# Altium footprint library PcbLib1.PcbLib: 13 footprints
Each footprint in its own frame and in the unit in brackets; x right, y up, seen from the top. Pads: shape width x height; smd on the part's side, far side on the other; paste and mask are expansions set on the pad; w line width, h text height; cw(c..) or ccw(c..) is an arc to the next point about the centre after c.
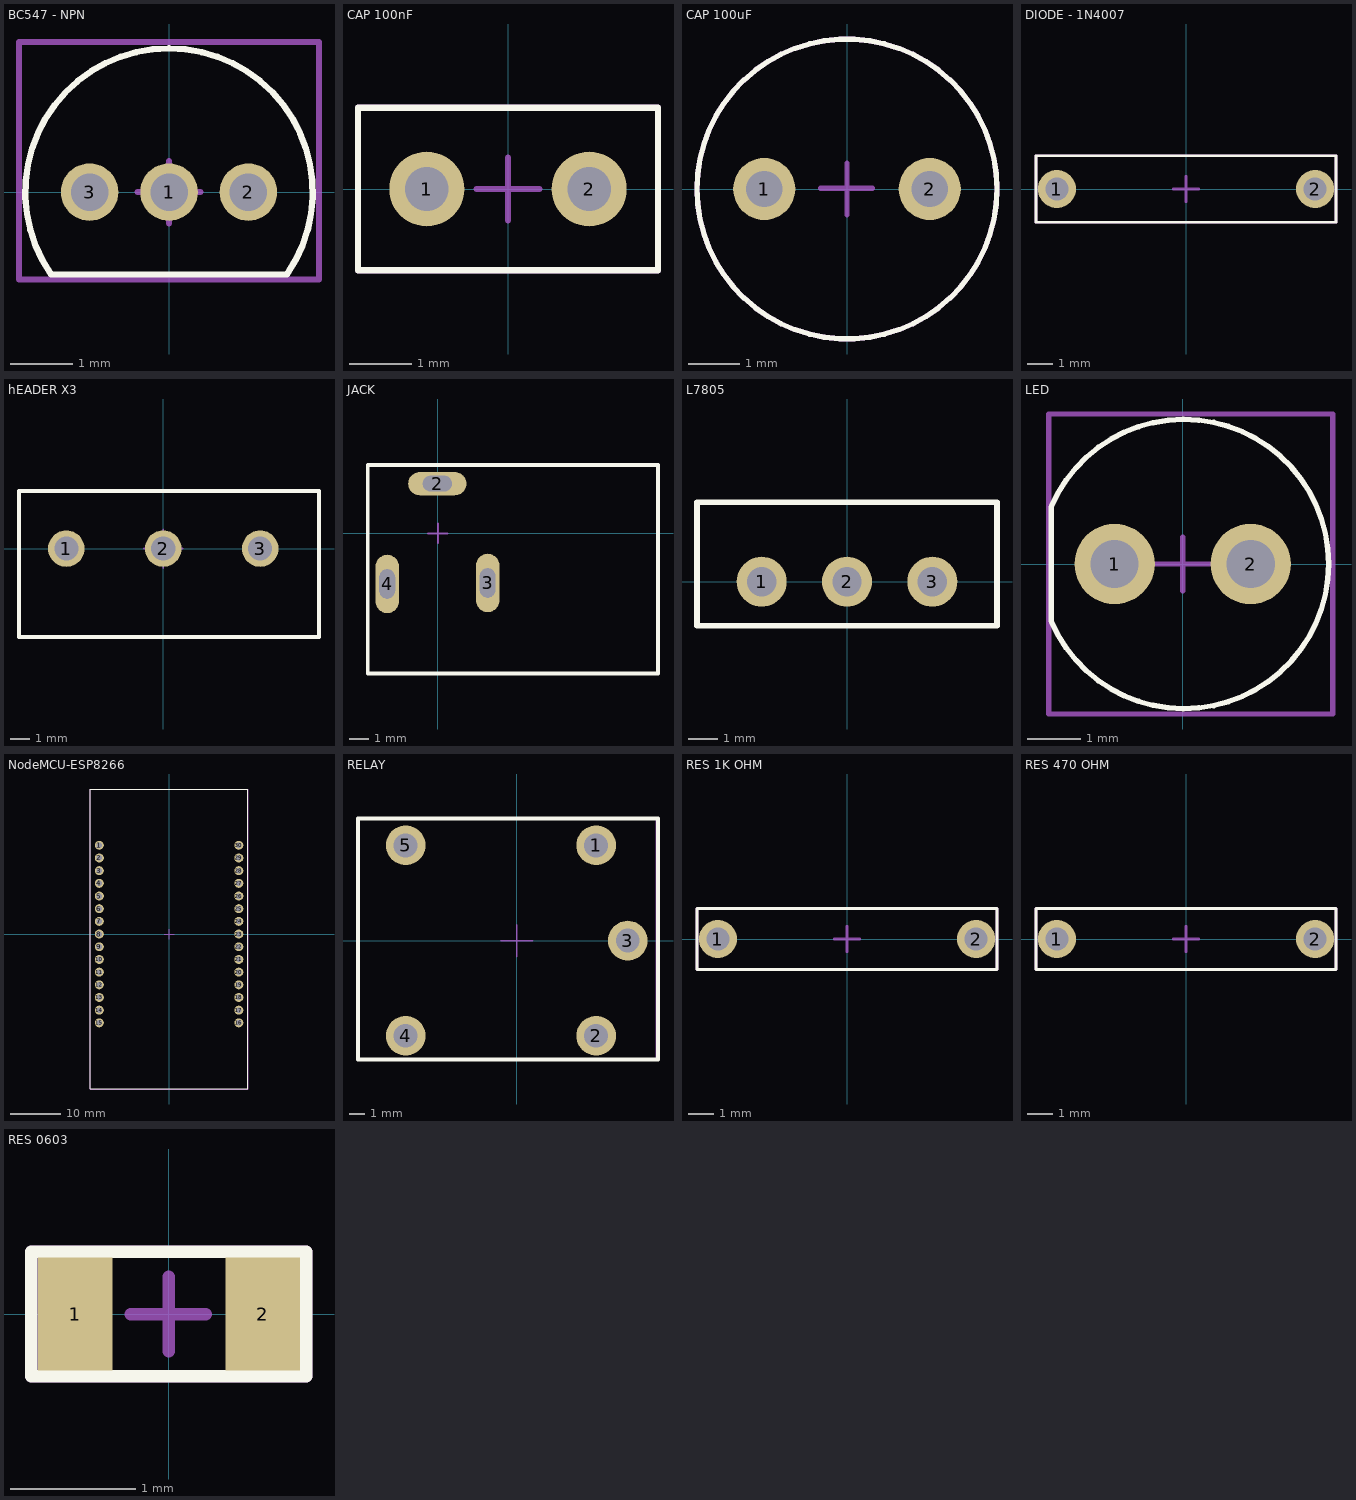
[diagram p0: the footprints below, top view; thin cyan lines are the x and y axes]

## BC547 - NPN [mm]
pads (3):
  round 0.92 hole 0.6 mask+0.05: 1(0,0) 2(1.27,0) 3(-1.27,0)
Top Overlay:
  lines w0.1: -1.884,-1.319 cw(c0,0) 1.884,-1.319 -1.883,-1.319
Top Component Center:
  lines w0.1: -0.5,0 0.5,0 ; 0,-0.5 0,0.5 ; -2.4,-1.4 2.4,-1.4 2.4,2.4 -2.4,2.4 -2.4,-1.4
Top Designator:
  lines w0.1: -2.4,-1.4 -2.4,2.4 2.4,2.4 2.4,-1.4 -2.4,-1.4
  text "'.Designator'" at -2.8,-0.5 h0.5
3D body "bc547b.stp": height 5.33, standoff -13.47, extent -2.35,-1.376 2.35,2.35

## CAP 100nF [mm]
pads (2):
  round 1.2 hole 0.7 mask+0.05: 1(-1.3,0) 2(1.3,0)
Top Overlay:
  lines w0.1: -2.4,-1.3 -2.4,1.3 2.4,1.3 2.4,-1.3 -2.4,-1.3
Top Component Center:
  lines w0.1: -0.5,0 0.5,0 ; 0,-0.5 0,0.5 ; -2.4,-1.3 -2.4,1.3 2.4,1.3 2.4,-1.3 -2.4,-1.3
Top Designator:
  lines w0.1: -2.4,-1.3 2.4,-1.3 2.4,1.3 -2.4,1.3 -2.4,-1.3
  text "'.Designator'" at -2.9,-0.4 h0.5
3D body "10pF Ceramic Disc 2.STEP": height 7.35, standoff -6.68, extent -2.35,-1.25 2.35,1.25

## CAP 100uF [mm]
pads (2):
  round 1.2 hole 0.7 mask+0.05: 1(-1.6,0) 2(1.6,0)
Top Overlay:
  circle w0.1: c0,0 r2.9
Top Component Center:
  circle w0.1: c0,0 r2.9
  lines w0.1: -0.509,0.014 0.491,0.014 ; 0,-0.5 0,0.5
Top Designator:
  circle w0.1: c0,0 r2.9
  text "'.Designator'" at -3,-0.3 h0.5
3D body "100uF 16V electr 6.3 x11mm -P.diameter 3.2mm-Black-White.stp": height 11.2, standoff -3.9, extent -3.15,-3.147 3.15,3.147

## DIODE - 1N4007 [mm]
pads (2):
  round 1.5 hole 0.9 mask+0.05: 1(-5.08,0) 2(5.08,0)
Top Overlay:
  lines w0.1: -5.9,-1.3 5.9,-1.3 5.9,1.3 -5.9,1.3 -5.9,-1.3
Top Component Center:
  lines w0.1: -0.5,0 0.5,0 ; 0,-0.5 0,0.5 ; -5.9,-1.3 5.9,-1.3 5.9,1.3 -5.9,1.3 -5.9,-1.3
Top Designator:
  lines w0.1: -5.9,-1.3 5.9,-1.3 5.9,1.3 -5.9,1.3 -5.9,-1.3
  text "'.Designator'" at -3.1,-0.4 h0.5
3D body "1N4007P10.STEP": height 3.58, standoff -2.17, extent -5.35,-1.25 5.35,1.25

## hEADER X3 [mm]
pads (3):
  round 1.9 hole 1.25: 1(-5.04,0) 2(0,0) 3(5.04,0)
Top Overlay:
  lines w0.2: -7.5,-4.6 8.1,-4.6 8.1,3 -7.5,3 -7.5,-4.6
Top Component Center:
  lines w0.1: -1,0 1,0 ; 0,-1 0,1 ; -7.5,-4.6 -7.5,3 8.1,3 8.1,-4.6 -7.5,-4.6
Top Designator:
  lines w0.1: -7.5,-4.6 -7.5,3 8.1,3 8.1,-4.6 -7.5,-4.6
  text "'.Designator'" at -5.9,-1 h1
3D body "User Library-Terminal-Screw-3A-3way.step": height 10, standoff -3, extent -7.5,-4.6 8.1,3

## JACK [mm]
pads (3):
  oval 3x1.2 hole 0.8 slot 1.5 at 0 deg: 2(-0.025,2.55)
  oval 1.2x3 hole 0.8 slot 1.5 at 90 deg: 3(2.558,-2.548) 4(-2.6,-2.6)
Top Overlay:
  lines w0.2: -3.6,-7.2 11.3,-7.2 11.3,3.5 -3.6,3.5 -3.6,-7.2
Top Component Center:
  lines w0.1: -0.5,0 0.5,0 ; 0,-0.5 0,0.5 ; -3.6,-7.2 11.3,-7.2 11.3,3.5 -3.6,3.5 -3.6,-7.2
Top Designator:
  lines w0.1: -3.6,-7.2 11.3,-7.2 11.3,3.5 -3.6,3.5 -3.6,-7.2
  text "'.Designator'" at -1.7,-2.6 h1
3D body "DC Power Jack 5.5mm x 2.1mm.STEP": height 10.78, standoff -3.6, extent -3.46,-7.02 11.16,2.75

## L7805 [mm]
pads (3):
  round 1.7 hole 1 mask+0.05: 1(-2.9,0) 2(0,0) 3(2.9,0)
Top Overlay:
  lines w0.2: -5.1,-1.5 5.1,-1.5 5.1,2.7 -5.1,2.7 -5.1,-1.5
Top Component Center:
  lines w0.1: -0.5,0 0.5,0 ; 0,-0.5 0,0.5 ; -5.1,-1.5 5.1,-1.5 5.1,2.7 -5.1,2.7 -5.1,-1.5
Top Designator:
  lines w0.1: -5.1,-1.5 -5.1,2.7 5.1,2.7 5.1,-1.5 -5.1,-1.5
  text "'.Designator'" at -5.7,-0.5 h1
3D body "User Library-L7805.step": height 21.75, standoff -7.06, extent -5.08,-1.495 5.08,2.7

## LED [mm]
pads (2):
  round 1.5 hole 0.9 mask+0.05: 1(-1.27,0) 2(1.27,0)
Top Overlay:
  lines w0.1: -2.453,-1.062 -2.453,1.062 ; -2.449,-1.082 ccw(c0.025,0) -2.449,1.082
Top Component Center:
  lines w0.1: -0.5,0 0.5,0 ; 0,-0.5 0,0.5 ; -2.5,-2.8 2.8,-2.8 2.8,2.8 -2.5,2.8 -2.5,-2.8
Top Designator:
  lines w0.1: -2.5,-2.8 2.8,-2.8 2.8,2.8 -2.5,2.8 -2.5,-2.8
  text "'.Designator'" at -2.7,-0.5 h0.5
3D body "LED 5mm Red.step": height 8.9, standoff -5.4, extent -2.5,-2.797 2.8,2.798

## NodeMCU-ESP8266 [mm]
pads (30):
  round 1.8 hole 1.1 mask+0.05: 1(-13.97,17.78) 2(-13.97,15.24) 3(-13.97,12.7) 4(-13.97,10.16) 5(-13.97,7.62) 6(-13.97,5.08) 7(-13.97,2.54) 8(-13.97,0) 9(-13.97,-2.54) 10(-13.97,-5.08) 11(-13.97,-7.62) 12(-13.97,-10.16) 13(-13.97,-12.7) 14(-13.97,-15.24) 15(-13.97,-17.78) 16(13.97,-17.78) 17(13.97,-15.24) 18(13.97,-12.7) 19(13.97,-10.16) 20(13.97,-7.62) 21(13.97,-5.08) 22(13.97,-2.54) 23(13.97,0) 24(13.97,2.54) 25(13.97,5.08) 26(13.97,7.62) 27(13.97,10.16) 28(13.97,12.7) 29(13.97,15.24) 30(13.97,17.78)
Top Overlay:
  lines w0.2: -15.825,-31 15.8,-31 15.8,29.05 -15.825,29.05 -15.825,-31
Top Component Center:
  lines w0.1: -1,0 1,0 ; 0,-1 0,1 ; -15.825,-31.025 -15.825,28.95 -15.825,29.05 15.775,29.05 15.775,-31.025 -15.825,-31.025
Top Designator:
  lines w0.1: -15.825,-31.025 -15.825,28.95 -15.825,29.05 15.775,29.05 15.775,-31.025 -15.825,-31.025
  text "'.Designator'" at -11.275,-1.9 h2
3D body "User Library-Lolin NodeMCU ESP8266 V3.step": height 7.15, standoff -5.99, extent -15.77,-30.97 15.73,29.01

## RELAY [mm]
pads (5):
  round 2.5 hole 1.5 mask+0.05: 1(5,6) 2(5,-6) 3(7,0) 4(-7,-6) 5(-7,6)
Top Overlay:
  lines w0.25: -10,-7.5 8.9,-7.5 8.9,7.7 -10,7.7 -10,-7.5
Top Component Center:
  lines w0.1: -1,0 1,0 ; 0,-1 0,1 ; -10,-7.5 8.8,-7.5 8.8,7.7 -10,7.7 -10,-7.5
Top Designator:
  lines w0.1: -10,-7.5 8.8,-7.5 8.8,7.7 -10,7.7 -10,-7.5
  text "'.Designator'" at -8.7,-1.2 h1.52
3D body "User Library-JQC-35FC(T73)-1.step": height 15.11, standoff -2, extent -10,-7.5 8.8,7.7

## RES 1K OHM [mm]
pads (2):
  round 1.5 hole 0.9 mask+0.05: 1(-5.08,0) 2(5.08,0)
Top Overlay:
  lines w0.1: -5.9,-1.2 -5.9,1.2 5.9,1.2 5.9,-1.2 -5.9,-1.2
Top Component Center:
  lines w0.1: -0.5,0 0.5,0 ; 0,-0.5 0,0.5 ; -5.9,-1.2 -5.9,1.2 5.9,1.2 5.9,-1.2 -5.9,-1.2
Top Designator:
  lines w0.1: -5.9,-1.2 5.9,-1.2 5.9,1.2 -5.9,1.2 -5.9,-1.2
  text "'.Designator'" at -2.8,-0.5 h0.5
3D body "Axial_04_1k.step": height 2.63, standoff -2.5, extent -5.43,-1.143 5.23,1.149

## RES 470 OHM [mm]
pads (2):
  round 1.5 hole 0.9 mask+0.05: 1(-5.08,0) 2(5.08,0)
Top Overlay:
  lines w0.1: -5.9,-1.2 -5.9,1.2 5.9,1.2 5.9,-1.2 -5.9,-1.2
Top Component Center:
  lines w0.1: -0.5,0 0.5,0 ; 0,-0.5 0,0.5 ; -5.9,-1.2 -5.9,1.2 5.9,1.2 5.9,-1.2 -5.9,-1.2
Top Designator:
  lines w0.1: -5.9,-1.2 5.9,-1.2 5.9,1.2 -5.9,1.2 -5.9,-1.2
  text "'.Designator'" at -2.8,-0.5 h0.5
3D body "User Library-Res40-Axial Short 0_25W-470R.step": height 2.41, standoff -2, extent -5.38,-1.175 5.38,1.225

## RES 0603 [mm]
pads (2):
  rect 0.6x0.9 smd mask+0.05: 1(-0.75,0) 2(0.75,0)
Top Overlay:
  lines w0.1: -1.1,-0.5 -1.1,0.5 1.1,0.5 1.1,-0.5 -1.1,-0.5
Top Component Center:
  lines w0.1: -0.308,-0.001 0.292,-0.001 ; 0,-0.3 0,0.3 ; -1.1,-0.5 -1.1,0.5 1.1,0.5 1.1,-0.5 -1.1,-0.5
Top Designator:
  lines w0.1: -1.1,-0.5 -1.1,0.5 1.1,0.5 1.1,-0.5 -1.1,-0.5
  text "'.Designator'" at -1.2,-0.2 h0.2
3D body "RESC0603 v2.step": height 0.45, standoff 0, extent -0.8,-0.4 0.8,0.4